# Altium integrated library Samtec 2 mm Pitch Terminal Strips.IntLib: 623 symbols (part 2 of 5) (continued)
## TMM-103-01-T-S-RA
designator P?
Low Profile Through-Hole Header, Right Angle, -55 to 105 degC, 2 mm Pitch, 3-Pin, Male, RoHS; Manufacturer: Samtec; PartNumber: TMM-103-01-T-S-RA; Pitch: 2 mm; DatasheetVersion: F-214; PackageVersion: V, 3/2013; PackageReference: TMM-103-01-X-S-RA; PackageDescription: 2 mm Terminal Strip Assembly (R/A); Supplier 1: Newark; Supplier Part Number 1: 85P2046; Orientation: Right Angle; RoHS: True; Temperature Range: -55 to 105 degC; Mounting Technology: Through-hole; ComponentLink1Description: Manufacturer URL; ComponentLink1URL: http://www.samtec.com; ComponentLink2Description: Datasheet; ComponentLink2URL: http://d2a072wq521u33.cloudfront.net/catalog_english//TMM_TH.PDF; ComponentLink3Description: Package Specification; ComponentLink3URL: http://www.samtec.com/documents/webfiles/cpdf/TMM-1XX-XX-XX-X-RA-XXX-MKT.pdf
footprint SMTC-TMM-103-01-X-S-RA (Terminal Strip Assembly, 1x3 Pins, Right Angle, 2mm Pitch, Male)
pins: 1, 2, 3

## TMM-105-01-F-D-001
designator P?
Low Profile Through-Hole Header, Vertical, -55 to 125 degC, 2 mm Pitch, 10-Pin, Male, RoHS; Manufacturer: Samtec; PartNumber: TMM-105-01-F-D-001; Pitch: 2 mm; DatasheetVersion: F-214; PackageVersion: AW, 11/2011; PackageReference: TMM-105-01-X-D-001; PackageDescription: 2 mm Terminal Strip Assembly; Orientation: Vertical; RoHS: True; Temperature Range: -55 to 125 degC; Mounting Technology: Through-hole; ComponentLink1Description: Manufacturer URL; ComponentLink1URL: http://www.samtec.com; ComponentLink2Description: Datasheet; ComponentLink2URL: http://d2a072wq521u33.cloudfront.net/catalog_english//TMM_TH.PDF; ComponentLink3Description: Package Specification; ComponentLink3URL: http://www.samtec.com/documents/webfiles/cpdf/TMM-1XX-XX-XX-X-XX-XXX-MKT1.pdf
footprint SMTC-TMM-105-01-X-D-001 (Terminal Strip Assembly, 2x5 Pins, Vertical, 2mm Pitch, Male)
pins: 1, 2, 3, 4, 5, 6, 7, 8, 9, 10

## TMM-105-01-F-S-RA
designator P?
Low Profile Through-Hole Header, Right Angle, -55 to 125 degC, 2 mm Pitch, 5-Pin, Male, RoHS; Manufacturer: Samtec; PartNumber: TMM-105-01-F-S-RA; Pitch: 2 mm; DatasheetVersion: F-214; PackageVersion: V, 3/2013; PackageReference: TMM-105-01-X-S-RA; PackageDescription: 2 mm Terminal Strip Assembly (R/A); Orientation: Right Angle; RoHS: True; Temperature Range: -55 to 125 degC; Mounting Technology: Through-hole; ComponentLink1Description: Manufacturer URL; ComponentLink1URL: http://www.samtec.com; ComponentLink2Description: Datasheet; ComponentLink2URL: http://d2a072wq521u33.cloudfront.net/catalog_english//TMM_TH.PDF; ComponentLink3Description: Package Specification; ComponentLink3URL: http://www.samtec.com/documents/webfiles/cpdf/TMM-1XX-XX-XX-X-RA-XXX-MKT.pdf
footprint SMTC-TMM-105-01-X-S-RA (Terminal Strip Assembly, 1x5 Pins, Right Angle, 2mm Pitch, Male)
pins: 1, 2, 3, 4, 5

## TMM-105-01-L-D-001
designator P?
Low Profile Through-Hole Header, Vertical, -55 to 125 degC, 2 mm Pitch, 10-Pin, Male, RoHS; Manufacturer: Samtec; PartNumber: TMM-105-01-L-D-001; Pitch: 2 mm; DatasheetVersion: F-214; PackageVersion: AW, 11/2011; PackageReference: TMM-105-01-X-D-001; PackageDescription: 2 mm Terminal Strip Assembly; Orientation: Vertical; RoHS: True; Temperature Range: -55 to 125 degC; Mounting Technology: Through-hole; ComponentLink1Description: Manufacturer URL; ComponentLink1URL: http://www.samtec.com; ComponentLink2Description: Datasheet; ComponentLink2URL: http://d2a072wq521u33.cloudfront.net/catalog_english//TMM_TH.PDF; ComponentLink3Description: Package Specification; ComponentLink3URL: http://www.samtec.com/documents/webfiles/cpdf/TMM-1XX-XX-XX-X-XX-XXX-MKT1.pdf
footprint SMTC-TMM-105-01-X-D-001 (Terminal Strip Assembly, 2x5 Pins, Vertical, 2mm Pitch, Male)
pins: 1, 2, 3, 4, 5, 6, 7, 8, 9, 10

## TMM-105-01-L-S-RA
designator P?
Low Profile Through-Hole Header, Right Angle, -55 to 125 degC, 2 mm Pitch, 5-Pin, Male, RoHS; Manufacturer: Samtec; PartNumber: TMM-105-01-L-S-RA; Pitch: 2 mm; DatasheetVersion: F-214; PackageVersion: V, 3/2013; PackageReference: TMM-105-01-X-S-RA; PackageDescription: 2 mm Terminal Strip Assembly (R/A); Supplier 1: Newark; Supplier Part Number 1: 85P2829; Orientation: Right Angle; RoHS: True; Temperature Range: -55 to 125 degC; Mounting Technology: Through-hole; ComponentLink1Description: Manufacturer URL; ComponentLink1URL: http://www.samtec.com; ComponentLink2Description: Datasheet; ComponentLink2URL: http://d2a072wq521u33.cloudfront.net/catalog_english//TMM_TH.PDF; ComponentLink3Description: Package Specification; ComponentLink3URL: http://www.samtec.com/documents/webfiles/cpdf/TMM-1XX-XX-XX-X-RA-XXX-MKT.pdf
footprint SMTC-TMM-105-01-X-S-RA (Terminal Strip Assembly, 1x5 Pins, Right Angle, 2mm Pitch, Male)
pins: 1, 2, 3, 4, 5

## TMM-105-01-S-D-001
designator P?
Low Profile Through-Hole Header, Vertical, -55 to 125 degC, 2 mm Pitch, 10-Pin, Male, RoHS; Manufacturer: Samtec; PartNumber: TMM-105-01-S-D-001; Pitch: 2 mm; DatasheetVersion: F-214; PackageVersion: AW, 11/2011; PackageReference: TMM-105-01-X-D-001; PackageDescription: 2 mm Terminal Strip Assembly; Orientation: Vertical; RoHS: True; Temperature Range: -55 to 125 degC; Mounting Technology: Through-hole; ComponentLink1Description: Manufacturer URL; ComponentLink1URL: http://www.samtec.com; ComponentLink2Description: Datasheet; ComponentLink2URL: http://d2a072wq521u33.cloudfront.net/catalog_english//TMM_TH.PDF; ComponentLink3Description: Package Specification; ComponentLink3URL: http://www.samtec.com/documents/webfiles/cpdf/TMM-1XX-XX-XX-X-XX-XXX-MKT1.pdf
footprint SMTC-TMM-105-01-X-D-001 (Terminal Strip Assembly, 2x5 Pins, Vertical, 2mm Pitch, Male)
pins: 1, 2, 3, 4, 5, 6, 7, 8, 9, 10

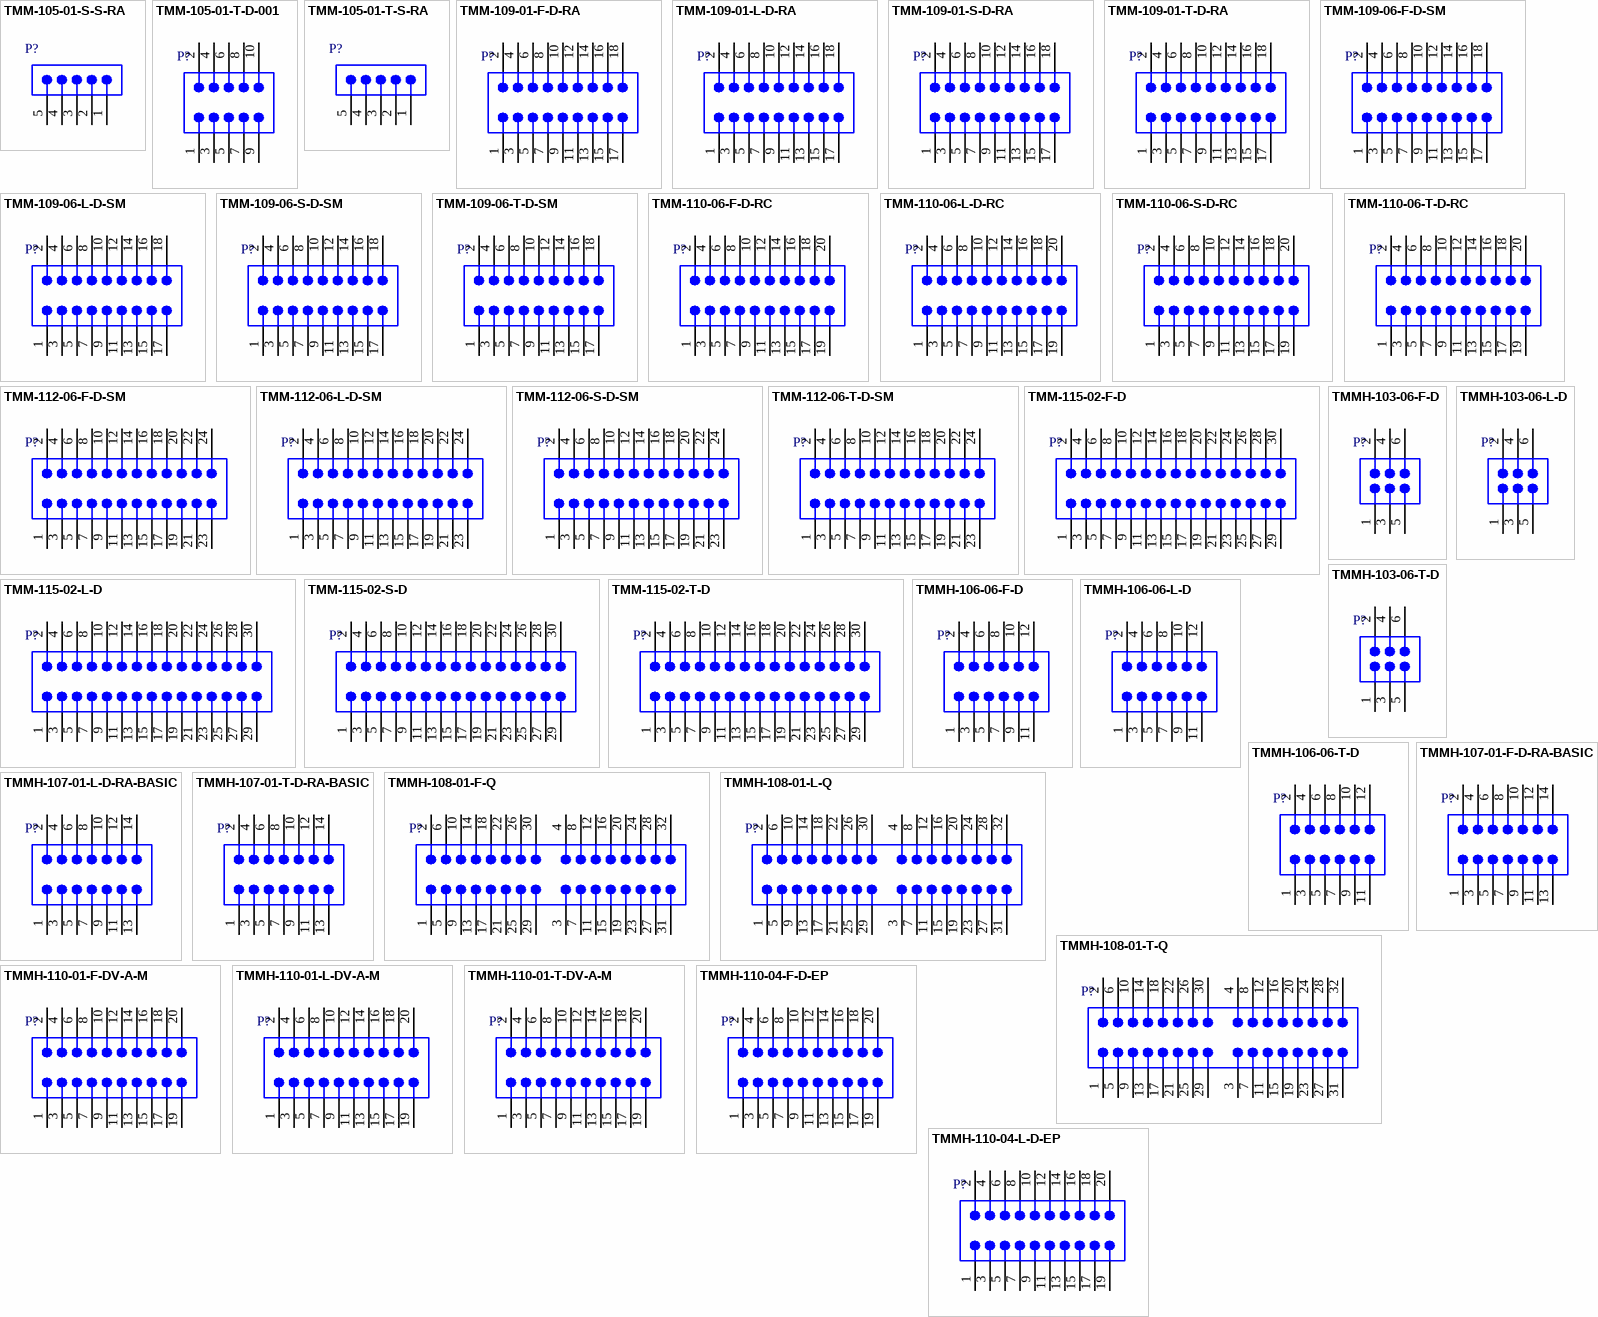
[diagram p6: symbols TMM-105-01-S-S-RA to TMMH-110-04-L-D-EP]

## TMM-105-01-S-S-RA
designator P?
Low Profile Through-Hole Header, Right Angle, -55 to 125 degC, 2 mm Pitch, 5-Pin, Male, RoHS; Manufacturer: Samtec; PartNumber: TMM-105-01-S-S-RA; Pitch: 2 mm; DatasheetVersion: F-214; PackageVersion: V, 3/2013; PackageReference: TMM-105-01-X-S-RA; PackageDescription: 2 mm Terminal Strip Assembly (R/A); Orientation: Right Angle; RoHS: True; Temperature Range: -55 to 125 degC; Mounting Technology: Through-hole; ComponentLink1Description: Manufacturer URL; ComponentLink1URL: http://www.samtec.com; ComponentLink2Description: Datasheet; ComponentLink2URL: http://d2a072wq521u33.cloudfront.net/catalog_english//TMM_TH.PDF; ComponentLink3Description: Package Specification; ComponentLink3URL: http://www.samtec.com/documents/webfiles/cpdf/TMM-1XX-XX-XX-X-RA-XXX-MKT.pdf
footprint SMTC-TMM-105-01-X-S-RA (Terminal Strip Assembly, 1x5 Pins, Right Angle, 2mm Pitch, Male)
pins: 1, 2, 3, 4, 5

## TMM-105-01-T-D-001
designator P?
Low Profile Through-Hole Header, Vertical, -55 to 105 degC, 2 mm Pitch, 10-Pin, Male, RoHS; Manufacturer: Samtec; PartNumber: TMM-105-01-T-D-001; Pitch: 2 mm; DatasheetVersion: F-214; PackageVersion: AW, 11/2011; PackageReference: TMM-105-01-X-D-001; PackageDescription: 2 mm Terminal Strip Assembly; Orientation: Vertical; RoHS: True; Temperature Range: -55 to 105 degC; Mounting Technology: Through-hole; ComponentLink1Description: Manufacturer URL; ComponentLink1URL: http://www.samtec.com; ComponentLink2Description: Datasheet; ComponentLink2URL: http://d2a072wq521u33.cloudfront.net/catalog_english//TMM_TH.PDF; ComponentLink3Description: Package Specification; ComponentLink3URL: http://www.samtec.com/documents/webfiles/cpdf/TMM-1XX-XX-XX-X-XX-XXX-MKT1.pdf
footprint SMTC-TMM-105-01-X-D-001 (Terminal Strip Assembly, 2x5 Pins, Vertical, 2mm Pitch, Male)
pins: 1, 2, 3, 4, 5, 6, 7, 8, 9, 10

## TMM-105-01-T-S-RA
designator P?
Low Profile Through-Hole Header, Right Angle, -55 to 105 degC, 2 mm Pitch, 5-Pin, Male, RoHS; Manufacturer: Samtec; PartNumber: TMM-105-01-T-S-RA; Pitch: 2 mm; DatasheetVersion: F-214; PackageVersion: V, 3/2013; PackageReference: TMM-105-01-X-S-RA; PackageDescription: 2 mm Terminal Strip Assembly (R/A); Supplier 1: Newark; Supplier Part Number 1: 85P3000; Orientation: Right Angle; RoHS: True; Temperature Range: -55 to 105 degC; Mounting Technology: Through-hole; ComponentLink1Description: Manufacturer URL; ComponentLink1URL: http://www.samtec.com; ComponentLink2Description: Datasheet; ComponentLink2URL: http://d2a072wq521u33.cloudfront.net/catalog_english//TMM_TH.PDF; ComponentLink3Description: Package Specification; ComponentLink3URL: http://www.samtec.com/documents/webfiles/cpdf/TMM-1XX-XX-XX-X-RA-XXX-MKT.pdf
footprint SMTC-TMM-105-01-X-S-RA (Terminal Strip Assembly, 1x5 Pins, Right Angle, 2mm Pitch, Male)
pins: 1, 2, 3, 4, 5

## TMM-109-01-F-D-RA
designator P?
Low Profile Through-Hole Header, Right Angle, -55 to 125 degC, 2 mm Pitch, 18-Pin, Male, RoHS; Manufacturer: Samtec; PartNumber: TMM-109-01-F-D-RA; Pitch: 2 mm; DatasheetVersion: F-214; PackageVersion: V, 3/2013; PackageReference: TMM-109-01-X-D-RA; PackageDescription: 2 mm Terminal Strip Assembly (R/A); Orientation: Right Angle; RoHS: True; Temperature Range: -55 to 125 degC; Mounting Technology: Through-hole; ComponentLink1Description: Manufacturer URL; ComponentLink1URL: http://www.samtec.com; ComponentLink2Description: Datasheet; ComponentLink2URL: http://d2a072wq521u33.cloudfront.net/catalog_english//TMM_TH.PDF; ComponentLink3Description: Package Specification; ComponentLink3URL: http://www.samtec.com/documents/webfiles/cpdf/TMM-1XX-XX-XX-X-RA-XXX-MKT.pdf
footprint SMTC-TMM-109-01-X-D-RA (Terminal Strip Assembly, 2x9 Pins, Right Angle, 2mm Pitch, Male)
pins: 1, 2, 3, 4, 5, 6, 7, 8, 9, 10, 11, 12, 13, 14, 15, 16, 17, 18

## TMM-109-01-L-D-RA
designator P?
Low Profile Through-Hole Header, Right Angle, -55 to 125 degC, 2 mm Pitch, 18-Pin, Male, RoHS; Manufacturer: Samtec; PartNumber: TMM-109-01-L-D-RA; Pitch: 2 mm; DatasheetVersion: F-214; PackageVersion: V, 3/2013; PackageReference: TMM-109-01-X-D-RA; PackageDescription: 2 mm Terminal Strip Assembly (R/A); Supplier 1: Newark; Supplier Part Number 1: 85P4848; Orientation: Right Angle; RoHS: True; Temperature Range: -55 to 125 degC; Mounting Technology: Through-hole; ComponentLink1Description: Manufacturer URL; ComponentLink1URL: http://www.samtec.com; ComponentLink2Description: Datasheet; ComponentLink2URL: http://d2a072wq521u33.cloudfront.net/catalog_english//TMM_TH.PDF; ComponentLink3Description: Package Specification; ComponentLink3URL: http://www.samtec.com/documents/webfiles/cpdf/TMM-1XX-XX-XX-X-RA-XXX-MKT.pdf
footprint SMTC-TMM-109-01-X-D-RA (Terminal Strip Assembly, 2x9 Pins, Right Angle, 2mm Pitch, Male)
pins: 1, 2, 3, 4, 5, 6, 7, 8, 9, 10, 11, 12, 13, 14, 15, 16, 17, 18

## TMM-109-01-S-D-RA
designator P?
Low Profile Through-Hole Header, Right Angle, -55 to 125 degC, 2 mm Pitch, 18-Pin, Male, RoHS; Manufacturer: Samtec; PartNumber: TMM-109-01-S-D-RA; Pitch: 2 mm; DatasheetVersion: F-214; PackageVersion: V, 3/2013; PackageReference: TMM-109-01-X-D-RA; PackageDescription: 2 mm Terminal Strip Assembly (R/A); Orientation: Right Angle; RoHS: True; Temperature Range: -55 to 125 degC; Mounting Technology: Through-hole; ComponentLink1Description: Manufacturer URL; ComponentLink1URL: http://www.samtec.com; ComponentLink2Description: Datasheet; ComponentLink2URL: http://d2a072wq521u33.cloudfront.net/catalog_english//TMM_TH.PDF; ComponentLink3Description: Package Specification; ComponentLink3URL: http://www.samtec.com/documents/webfiles/cpdf/TMM-1XX-XX-XX-X-RA-XXX-MKT.pdf
footprint SMTC-TMM-109-01-X-D-RA (Terminal Strip Assembly, 2x9 Pins, Right Angle, 2mm Pitch, Male)
pins: 1, 2, 3, 4, 5, 6, 7, 8, 9, 10, 11, 12, 13, 14, 15, 16, 17, 18

## TMM-109-01-T-D-RA
designator P?
Low Profile Through-Hole Header, Right Angle, -55 to 105 degC, 2 mm Pitch, 18-Pin, Male, RoHS; Manufacturer: Samtec; PartNumber: TMM-109-01-T-D-RA; Pitch: 2 mm; DatasheetVersion: F-214; PackageVersion: V, 3/2013; PackageReference: TMM-109-01-X-D-RA; PackageDescription: 2 mm Terminal Strip Assembly (R/A); Supplier 1: Newark; Supplier Part Number 1: 85P4970; Orientation: Right Angle; RoHS: True; Temperature Range: -55 to 105 degC; Mounting Technology: Through-hole; ComponentLink1Description: Manufacturer URL; ComponentLink1URL: http://www.samtec.com; ComponentLink2Description: Datasheet; ComponentLink2URL: http://d2a072wq521u33.cloudfront.net/catalog_english//TMM_TH.PDF; ComponentLink3Description: Package Specification; ComponentLink3URL: http://www.samtec.com/documents/webfiles/cpdf/TMM-1XX-XX-XX-X-RA-XXX-MKT.pdf
footprint SMTC-TMM-109-01-X-D-RA (Terminal Strip Assembly, 2x9 Pins, Right Angle, 2mm Pitch, Male)
pins: 1, 2, 3, 4, 5, 6, 7, 8, 9, 10, 11, 12, 13, 14, 15, 16, 17, 18

## TMM-109-06-F-D-SM
designator P?
Low Profile SMT Header, Vertical, -55 to 125 degC, 2 mm Pitch, 18-Pin, Male, RoHS; Manufacturer: Samtec; PartNumber: TMM-109-06-F-D-SM; Pitch: 2 mm; DatasheetVersion: F-214; PackageVersion: BY, 10/2013; PackageReference: TMM-109-06-X-D-SM; PackageDescription: 2 mm Terminal Strip Assembly; Orientation: Vertical; RoHS: True; Temperature Range: -55 to 125 degC; Mounting Technology: Surface Mount; ComponentLink1Description: Manufacturer URL; ComponentLink1URL: http://www.samtec.com; ComponentLink2Description: Datasheet; ComponentLink2URL: http://d2a072wq521u33.cloudfront.net/catalog_english//TMM_SM.PDF; ComponentLink3Description: Package Specification; ComponentLink3URL: http://www.samtec.com/documents/webfiles/cpdf/TMM-1XX-XX-XX-X-SM-XX-X-MKT.pdf
footprint SMTC-TMM-109-06-X-D-SM (Terminal Strip Assembly, 2x9 Pins, Vertical, 2mm Pitch, Male)
pins: 1, 2, 3, 4, 5, 6, 7, 8, 9, 10, 11, 12, 13, 14, 15, 16, 17, 18

## TMM-109-06-L-D-SM
designator P?
Low Profile SMT Header, Vertical, -55 to 125 degC, 2 mm Pitch, 18-Pin, Male, RoHS; Manufacturer: Samtec; PartNumber: TMM-109-06-L-D-SM; Pitch: 2 mm; DatasheetVersion: F-214; PackageVersion: BY, 10/2013; PackageReference: TMM-109-06-X-D-SM; PackageDescription: 2 mm Terminal Strip Assembly; Orientation: Vertical; RoHS: True; Temperature Range: -55 to 125 degC; Mounting Technology: Surface Mount; ComponentLink1Description: Manufacturer URL; ComponentLink1URL: http://www.samtec.com; ComponentLink2Description: Datasheet; ComponentLink2URL: http://d2a072wq521u33.cloudfront.net/catalog_english//TMM_SM.PDF; ComponentLink3Description: Package Specification; ComponentLink3URL: http://www.samtec.com/documents/webfiles/cpdf/TMM-1XX-XX-XX-X-SM-XX-X-MKT.pdf
footprint SMTC-TMM-109-06-X-D-SM (Terminal Strip Assembly, 2x9 Pins, Vertical, 2mm Pitch, Male)
pins: 1, 2, 3, 4, 5, 6, 7, 8, 9, 10, 11, 12, 13, 14, 15, 16, 17, 18

## TMM-109-06-S-D-SM
designator P?
Low Profile SMT Header, Vertical, -55 to 125 degC, 2 mm Pitch, 18-Pin, Male, RoHS; Manufacturer: Samtec; PartNumber: TMM-109-06-S-D-SM; Pitch: 2 mm; DatasheetVersion: F-214; PackageVersion: BY, 10/2013; PackageReference: TMM-109-06-X-D-SM; PackageDescription: 2 mm Terminal Strip Assembly; Orientation: Vertical; RoHS: True; Temperature Range: -55 to 125 degC; Mounting Technology: Surface Mount; ComponentLink1Description: Manufacturer URL; ComponentLink1URL: http://www.samtec.com; ComponentLink2Description: Datasheet; ComponentLink2URL: http://d2a072wq521u33.cloudfront.net/catalog_english//TMM_SM.PDF; ComponentLink3Description: Package Specification; ComponentLink3URL: http://www.samtec.com/documents/webfiles/cpdf/TMM-1XX-XX-XX-X-SM-XX-X-MKT.pdf
footprint SMTC-TMM-109-06-X-D-SM (Terminal Strip Assembly, 2x9 Pins, Vertical, 2mm Pitch, Male)
pins: 1, 2, 3, 4, 5, 6, 7, 8, 9, 10, 11, 12, 13, 14, 15, 16, 17, 18

## TMM-109-06-T-D-SM
designator P?
Low Profile SMT Header, Vertical, -55 to 105 degC, 2 mm Pitch, 18-Pin, Male, RoHS; Manufacturer: Samtec; PartNumber: TMM-109-06-T-D-SM; Pitch: 2 mm; DatasheetVersion: F-214; PackageVersion: BY, 10/2013; PackageReference: TMM-109-06-X-D-SM; PackageDescription: 2 mm Terminal Strip Assembly; Orientation: Vertical; RoHS: True; Temperature Range: -55 to 105 degC; Mounting Technology: Surface Mount; ComponentLink1Description: Manufacturer URL; ComponentLink1URL: http://www.samtec.com; ComponentLink2Description: Datasheet; ComponentLink2URL: http://d2a072wq521u33.cloudfront.net/catalog_english//TMM_SM.PDF; ComponentLink3Description: Package Specification; ComponentLink3URL: http://www.samtec.com/documents/webfiles/cpdf/TMM-1XX-XX-XX-X-SM-XX-X-MKT.pdf
footprint SMTC-TMM-109-06-X-D-SM (Terminal Strip Assembly, 2x9 Pins, Vertical, 2mm Pitch, Male)
pins: 1, 2, 3, 4, 5, 6, 7, 8, 9, 10, 11, 12, 13, 14, 15, 16, 17, 18

## TMM-110-06-F-D-RC
designator P?
Low Profile Through-Hole Header, Vertical, -55 to 125 degC, 2 mm Pitch, 20-Pin, Male, RoHS; Manufacturer: Samtec; PartNumber: TMM-110-06-F-D-RC; Pitch: 2 mm; DatasheetVersion: F-214; PackageVersion: AW, 11/2011; PackageReference: TMM-110-06-X-D-RC; PackageDescription: 2 mm Terminal Strip Assembly; Orientation: Vertical; RoHS: True; Temperature Range: -55 to 125 degC; Mounting Technology: Through-hole; ComponentLink1Description: Manufacturer URL; ComponentLink1URL: http://www.samtec.com; ComponentLink2Description: Datasheet; ComponentLink2URL: http://d2a072wq521u33.cloudfront.net/catalog_english//TMM_TH.PDF; ComponentLink3Description: Package Specification; ComponentLink3URL: http://www.samtec.com/documents/webfiles/cpdf/TMM-1XX-XX-XX-X-XX-XXX-MKT1.pdf
footprint SMTC-TMM-110-06-X-D-RC (Terminal Strip Assembly, 2x10 Pins, Vertical, 2mm Pitch, Male)
pins: 1, 2, 3, 4, 5, 6, 7, 8, 9, 10, 11, 12, 13, 14, 15, 16, 17, 18, 19, 20

## TMM-110-06-L-D-RC
designator P?
Low Profile Through-Hole Header, Vertical, -55 to 125 degC, 2 mm Pitch, 20-Pin, Male, RoHS; Manufacturer: Samtec; PartNumber: TMM-110-06-L-D-RC; Pitch: 2 mm; DatasheetVersion: F-214; PackageVersion: AW, 11/2011; PackageReference: TMM-110-06-X-D-RC; PackageDescription: 2 mm Terminal Strip Assembly; Orientation: Vertical; RoHS: True; Temperature Range: -55 to 125 degC; Mounting Technology: Through-hole; ComponentLink1Description: Manufacturer URL; ComponentLink1URL: http://www.samtec.com; ComponentLink2Description: Datasheet; ComponentLink2URL: http://d2a072wq521u33.cloudfront.net/catalog_english//TMM_TH.PDF; ComponentLink3Description: Package Specification; ComponentLink3URL: http://www.samtec.com/documents/webfiles/cpdf/TMM-1XX-XX-XX-X-XX-XXX-MKT1.pdf
footprint SMTC-TMM-110-06-X-D-RC (Terminal Strip Assembly, 2x10 Pins, Vertical, 2mm Pitch, Male)
pins: 1, 2, 3, 4, 5, 6, 7, 8, 9, 10, 11, 12, 13, 14, 15, 16, 17, 18, 19, 20

## TMM-110-06-S-D-RC
designator P?
Low Profile Through-Hole Header, Vertical, -55 to 125 degC, 2 mm Pitch, 20-Pin, Male, RoHS; Manufacturer: Samtec; PartNumber: TMM-110-06-S-D-RC; Pitch: 2 mm; DatasheetVersion: F-214; PackageVersion: AW, 11/2011; PackageReference: TMM-110-06-X-D-RC; PackageDescription: 2 mm Terminal Strip Assembly; Orientation: Vertical; RoHS: True; Temperature Range: -55 to 125 degC; Mounting Technology: Through-hole; ComponentLink1Description: Manufacturer URL; ComponentLink1URL: http://www.samtec.com; ComponentLink2Description: Datasheet; ComponentLink2URL: http://d2a072wq521u33.cloudfront.net/catalog_english//TMM_TH.PDF; ComponentLink3Description: Package Specification; ComponentLink3URL: http://www.samtec.com/documents/webfiles/cpdf/TMM-1XX-XX-XX-X-XX-XXX-MKT1.pdf
footprint SMTC-TMM-110-06-X-D-RC (Terminal Strip Assembly, 2x10 Pins, Vertical, 2mm Pitch, Male)
pins: 1, 2, 3, 4, 5, 6, 7, 8, 9, 10, 11, 12, 13, 14, 15, 16, 17, 18, 19, 20

## TMM-110-06-T-D-RC
designator P?
Low Profile Through-Hole Header, Vertical, -55 to 105 degC, 2 mm Pitch, 20-Pin, Male, RoHS; Manufacturer: Samtec; PartNumber: TMM-110-06-T-D-RC; Pitch: 2 mm; DatasheetVersion: F-214; PackageVersion: AW, 11/2011; PackageReference: TMM-110-06-X-D-RC; PackageDescription: 2 mm Terminal Strip Assembly; Orientation: Vertical; RoHS: True; Temperature Range: -55 to 105 degC; Mounting Technology: Through-hole; ComponentLink1Description: Manufacturer URL; ComponentLink1URL: http://www.samtec.com; ComponentLink2Description: Datasheet; ComponentLink2URL: http://d2a072wq521u33.cloudfront.net/catalog_english//TMM_TH.PDF; ComponentLink3Description: Package Specification; ComponentLink3URL: http://www.samtec.com/documents/webfiles/cpdf/TMM-1XX-XX-XX-X-XX-XXX-MKT1.pdf
footprint SMTC-TMM-110-06-X-D-RC (Terminal Strip Assembly, 2x10 Pins, Vertical, 2mm Pitch, Male)
pins: 1, 2, 3, 4, 5, 6, 7, 8, 9, 10, 11, 12, 13, 14, 15, 16, 17, 18, 19, 20

## TMM-112-06-F-D-SM
designator P?
Low Profile SMT Header, Vertical, -55 to 125 degC, 2 mm Pitch, 24-Pin, Male, RoHS; Manufacturer: Samtec; PartNumber: TMM-112-06-F-D-SM; Pitch: 2 mm; DatasheetVersion: F-214; PackageVersion: BY, 10/2013; PackageReference: TMM-112-06-X-D-SM; PackageDescription: 2 mm Terminal Strip Assembly; Orientation: Vertical; RoHS: True; Temperature Range: -55 to 125 degC; Mounting Technology: Surface Mount; ComponentLink1Description: Manufacturer URL; ComponentLink1URL: http://www.samtec.com; ComponentLink2Description: Datasheet; ComponentLink2URL: http://d2a072wq521u33.cloudfront.net/catalog_english//TMM_SM.PDF; ComponentLink3Description: Package Specification; ComponentLink3URL: http://www.samtec.com/documents/webfiles/cpdf/TMM-1XX-XX-XX-X-SM-XX-X-MKT.pdf
footprint SMTC-TMM-112-06-X-D-SM (Terminal Strip Assembly, 2x12 Pins, Vertical, 2mm Pitch, Male)
pins: 1, 2, 3, 4, 5, 6, 7, 8, 9, 10, 11, 12, 13, 14, 15, 16, 17, 18, 19, 20, 21, 22, 23, 24

## TMM-112-06-L-D-SM
designator P?
Low Profile SMT Header, Vertical, -55 to 125 degC, 2 mm Pitch, 24-Pin, Male, RoHS; Manufacturer: Samtec; PartNumber: TMM-112-06-L-D-SM; Pitch: 2 mm; DatasheetVersion: F-214; PackageVersion: BY, 10/2013; PackageReference: TMM-112-06-X-D-SM; PackageDescription: 2 mm Terminal Strip Assembly; Orientation: Vertical; RoHS: True; Temperature Range: -55 to 125 degC; Mounting Technology: Surface Mount; ComponentLink1Description: Manufacturer URL; ComponentLink1URL: http://www.samtec.com; ComponentLink2Description: Datasheet; ComponentLink2URL: http://d2a072wq521u33.cloudfront.net/catalog_english//TMM_SM.PDF; ComponentLink3Description: Package Specification; ComponentLink3URL: http://www.samtec.com/documents/webfiles/cpdf/TMM-1XX-XX-XX-X-SM-XX-X-MKT.pdf
footprint SMTC-TMM-112-06-X-D-SM (Terminal Strip Assembly, 2x12 Pins, Vertical, 2mm Pitch, Male)
pins: 1, 2, 3, 4, 5, 6, 7, 8, 9, 10, 11, 12, 13, 14, 15, 16, 17, 18, 19, 20, 21, 22, 23, 24

## TMM-112-06-S-D-SM
designator P?
Low Profile SMT Header, Vertical, -55 to 125 degC, 2 mm Pitch, 24-Pin, Male, RoHS; Manufacturer: Samtec; PartNumber: TMM-112-06-S-D-SM; Pitch: 2 mm; DatasheetVersion: F-214; PackageVersion: BY, 10/2013; PackageReference: TMM-112-06-X-D-SM; PackageDescription: 2 mm Terminal Strip Assembly; Orientation: Vertical; RoHS: True; Temperature Range: -55 to 125 degC; Mounting Technology: Surface Mount; ComponentLink1Description: Manufacturer URL; ComponentLink1URL: http://www.samtec.com; ComponentLink2Description: Datasheet; ComponentLink2URL: http://d2a072wq521u33.cloudfront.net/catalog_english//TMM_SM.PDF; ComponentLink3Description: Package Specification; ComponentLink3URL: http://www.samtec.com/documents/webfiles/cpdf/TMM-1XX-XX-XX-X-SM-XX-X-MKT.pdf
footprint SMTC-TMM-112-06-X-D-SM (Terminal Strip Assembly, 2x12 Pins, Vertical, 2mm Pitch, Male)
pins: 1, 2, 3, 4, 5, 6, 7, 8, 9, 10, 11, 12, 13, 14, 15, 16, 17, 18, 19, 20, 21, 22, 23, 24

## TMM-112-06-T-D-SM
designator P?
Low Profile SMT Header, Vertical, -55 to 105 degC, 2 mm Pitch, 24-Pin, Male, RoHS; Manufacturer: Samtec; PartNumber: TMM-112-06-T-D-SM; Pitch: 2 mm; DatasheetVersion: F-214; PackageVersion: BY, 10/2013; PackageReference: TMM-112-06-X-D-SM; PackageDescription: 2 mm Terminal Strip Assembly; Orientation: Vertical; RoHS: True; Temperature Range: -55 to 105 degC; Mounting Technology: Surface Mount; ComponentLink1Description: Manufacturer URL; ComponentLink1URL: http://www.samtec.com; ComponentLink2Description: Datasheet; ComponentLink2URL: http://d2a072wq521u33.cloudfront.net/catalog_english//TMM_SM.PDF; ComponentLink3Description: Package Specification; ComponentLink3URL: http://www.samtec.com/documents/webfiles/cpdf/TMM-1XX-XX-XX-X-SM-XX-X-MKT.pdf
footprint SMTC-TMM-112-06-X-D-SM (Terminal Strip Assembly, 2x12 Pins, Vertical, 2mm Pitch, Male)
pins: 1, 2, 3, 4, 5, 6, 7, 8, 9, 10, 11, 12, 13, 14, 15, 16, 17, 18, 19, 20, 21, 22, 23, 24

## TMM-115-02-F-D
designator P?
Low Profile Through-Hole Header, Vertical, -55 to 125 degC, 2 mm Pitch, 30-Pin, Male, RoHS; Manufacturer: Samtec; PartNumber: TMM-115-02-F-D; Pitch: 2 mm; DatasheetVersion: F-214; PackageVersion: AW, 11/2011; PackageReference: TMM-115-02-X-D; PackageDescription: 2 mm Terminal Strip Assembly; Orientation: Vertical; RoHS: True; Temperature Range: -55 to 125 degC; Mounting Technology: Through-hole; ComponentLink1Description: Manufacturer URL; ComponentLink1URL: http://www.samtec.com; ComponentLink2Description: Datasheet; ComponentLink2URL: http://d2a072wq521u33.cloudfront.net/catalog_english//TMM_TH.PDF; ComponentLink3Description: Package Specification; ComponentLink3URL: http://www.samtec.com/documents/webfiles/cpdf/TMM-1XX-XX-XX-X-XX-XXX-MKT1.pdf
footprint SMTC-TMM-115-02-X-D (Terminal Strip Assembly, 2x15 Pins, Vertical, 2mm Pitch, Male)
pins: 1, 2, 3, 4, 5, 6, 7, 8, 9, 10, 11, 12, 13, 14, 15, 16, 17, 18, 19, 20, 21, 22, 23, 24, 25, 26, 27, 28, 29, 30

## TMM-115-02-L-D
designator P?
Low Profile Through-Hole Header, Vertical, -55 to 125 degC, 2 mm Pitch, 30-Pin, Male, RoHS; Manufacturer: Samtec; PartNumber: TMM-115-02-L-D; Pitch: 2 mm; DatasheetVersion: F-214; PackageVersion: AW, 11/2011; PackageReference: TMM-115-02-X-D; PackageDescription: 2 mm Terminal Strip Assembly; Supplier 1: Newark; Supplier Part Number 1: 96H7246; Orientation: Vertical; RoHS: True; Temperature Range: -55 to 125 degC; Mounting Technology: Through-hole; ComponentLink1Description: Manufacturer URL; ComponentLink1URL: http://www.samtec.com; ComponentLink2Description: Datasheet; ComponentLink2URL: http://d2a072wq521u33.cloudfront.net/catalog_english//TMM_TH.PDF; ComponentLink3Description: Package Specification; ComponentLink3URL: http://www.samtec.com/documents/webfiles/cpdf/TMM-1XX-XX-XX-X-XX-XXX-MKT1.pdf
footprint SMTC-TMM-115-02-X-D (Terminal Strip Assembly, 2x15 Pins, Vertical, 2mm Pitch, Male)
pins: 1, 2, 3, 4, 5, 6, 7, 8, 9, 10, 11, 12, 13, 14, 15, 16, 17, 18, 19, 20, 21, 22, 23, 24, 25, 26, 27, 28, 29, 30

## TMM-115-02-S-D
designator P?
Low Profile Through-Hole Header, Vertical, -55 to 125 degC, 2 mm Pitch, 30-Pin, Male, RoHS; Manufacturer: Samtec; PartNumber: TMM-115-02-S-D; Pitch: 2 mm; DatasheetVersion: F-214; PackageVersion: AW, 11/2011; PackageReference: TMM-115-02-X-D; PackageDescription: 2 mm Terminal Strip Assembly; Orientation: Vertical; RoHS: True; Temperature Range: -55 to 125 degC; Mounting Technology: Through-hole; ComponentLink1Description: Manufacturer URL; ComponentLink1URL: http://www.samtec.com; ComponentLink2Description: Datasheet; ComponentLink2URL: http://d2a072wq521u33.cloudfront.net/catalog_english//TMM_TH.PDF; ComponentLink3Description: Package Specification; ComponentLink3URL: http://www.samtec.com/documents/webfiles/cpdf/TMM-1XX-XX-XX-X-XX-XXX-MKT1.pdf
footprint SMTC-TMM-115-02-X-D (Terminal Strip Assembly, 2x15 Pins, Vertical, 2mm Pitch, Male)
pins: 1, 2, 3, 4, 5, 6, 7, 8, 9, 10, 11, 12, 13, 14, 15, 16, 17, 18, 19, 20, 21, 22, 23, 24, 25, 26, 27, 28, 29, 30

## TMM-115-02-T-D
designator P?
Low Profile Through-Hole Header, Vertical, -55 to 105 degC, 2 mm Pitch, 30-Pin, Male, RoHS; Manufacturer: Samtec; PartNumber: TMM-115-02-T-D; Pitch: 2 mm; DatasheetVersion: F-214; PackageVersion: AW, 11/2011; PackageReference: TMM-115-02-X-D; PackageDescription: 2 mm Terminal Strip Assembly; Supplier 1: Newark; Supplier Part Number 1: 85P8003; Orientation: Vertical; RoHS: True; Temperature Range: -55 to 105 degC; Mounting Technology: Through-hole; ComponentLink1Description: Manufacturer URL; ComponentLink1URL: http://www.samtec.com; ComponentLink2Description: Datasheet; ComponentLink2URL: http://d2a072wq521u33.cloudfront.net/catalog_english//TMM_TH.PDF; ComponentLink3Description: Package Specification; ComponentLink3URL: http://www.samtec.com/documents/webfiles/cpdf/TMM-1XX-XX-XX-X-XX-XXX-MKT1.pdf
footprint SMTC-TMM-115-02-X-D (Terminal Strip Assembly, 2x15 Pins, Vertical, 2mm Pitch, Male)
pins: 1, 2, 3, 4, 5, 6, 7, 8, 9, 10, 11, 12, 13, 14, 15, 16, 17, 18, 19, 20, 21, 22, 23, 24, 25, 26, 27, 28, 29, 30

## TMMH-103-06-F-D
designator P?
Flexible Through-Hole Header, Vertical, -55 to 125 degC, 2 mm Pitch, 6-Pin, Male, RoHS; Manufacturer: Samtec; PartNumber: TMMH-103-06-F-D; Pitch: 2 mm; DatasheetVersion: F-214; PackageVersion: AR, 12/1996; PackageReference: TMMH-103-06-X-D; PackageDescription: 2mm x 2mm Terminal Strip Assembly; Supplier 1: Newark; Supplier Part Number 1: 85T6584; Orientation: Vertical; RoHS: True; Temperature Range: -55 to 125 degC; Mounting Technology: Through-hole; ComponentLink1Description: Manufacturer URL; ComponentLink1URL: http://www.samtec.com; ComponentLink2Description: Datasheet; ComponentLink2URL: http://d2a072wq521u33.cloudfront.net/catalog_english//TMMH_TH.PDF; ComponentLink3Description: Package Specification; ComponentLink3URL: http://www.samtec.com/documents/webfiles/cpdf/TMMH-1XX-XX-XX-D-XXX-XXX-MKT1.pdf
footprint SMTC-TMMH-103-06-X-D (Terminal Strip Assembly, 2x3 Pins, Vertical, 2mm Pitch, Male)
pins: 1, 2, 3, 4, 5, 6

## TMMH-103-06-L-D
designator P?
Flexible Through-Hole Header, Vertical, -55 to 125 degC, 2 mm Pitch, 6-Pin, Male, RoHS; Manufacturer: Samtec; PartNumber: TMMH-103-06-L-D; Pitch: 2 mm; DatasheetVersion: F-214; PackageVersion: AR, 12/1996; PackageReference: TMMH-103-06-X-D; PackageDescription: 2mm x 2mm Terminal Strip Assembly; Supplier 1: Newark; Supplier Part Number 1: 85T6587; Orientation: Vertical; RoHS: True; Temperature Range: -55 to 125 degC; Mounting Technology: Through-hole; ComponentLink1Description: Manufacturer URL; ComponentLink1URL: http://www.samtec.com; ComponentLink2Description: Datasheet; ComponentLink2URL: http://d2a072wq521u33.cloudfront.net/catalog_english//TMMH_TH.PDF; ComponentLink3Description: Package Specification; ComponentLink3URL: http://www.samtec.com/documents/webfiles/cpdf/TMMH-1XX-XX-XX-D-XXX-XXX-MKT1.pdf
footprint SMTC-TMMH-103-06-X-D (Terminal Strip Assembly, 2x3 Pins, Vertical, 2mm Pitch, Male)
pins: 1, 2, 3, 4, 5, 6

## TMMH-103-06-T-D
designator P?
Flexible Through-Hole Header, Vertical, -55 to 105 degC, 2 mm Pitch, 6-Pin, Male, RoHS; Manufacturer: Samtec; PartNumber: TMMH-103-06-T-D; Pitch: 2 mm; DatasheetVersion: F-214; PackageVersion: AR, 12/1996; PackageReference: TMMH-103-06-X-D; PackageDescription: 2mm x 2mm Terminal Strip Assembly; Supplier 1: Newark; Supplier Part Number 1: 85T6588; Orientation: Vertical; RoHS: True; Temperature Range: -55 to 105 degC; Mounting Technology: Through-hole; ComponentLink1Description: Manufacturer URL; ComponentLink1URL: http://www.samtec.com; ComponentLink2Description: Datasheet; ComponentLink2URL: http://d2a072wq521u33.cloudfront.net/catalog_english//TMMH_TH.PDF; ComponentLink3Description: Package Specification; ComponentLink3URL: http://www.samtec.com/documents/webfiles/cpdf/TMMH-1XX-XX-XX-D-XXX-XXX-MKT1.pdf
footprint SMTC-TMMH-103-06-X-D (Terminal Strip Assembly, 2x3 Pins, Vertical, 2mm Pitch, Male)
pins: 1, 2, 3, 4, 5, 6

## TMMH-106-06-F-D
designator P?
Flexible Through-Hole Header, Vertical, -55 to 125 degC, 2 mm Pitch, 12-Pin, Male, RoHS; Manufacturer: Samtec; PartNumber: TMMH-106-06-F-D; Pitch: 2 mm; DatasheetVersion: F-214; PackageVersion: AR, 12/1996; PackageReference: TMMH-106-06-X-D; PackageDescription: 2mm x 2mm Terminal Strip Assembly; Supplier 1: Newark; Supplier Part Number 1: 85T6611; Orientation: Vertical; RoHS: True; Temperature Range: -55 to 125 degC; Mounting Technology: Through-hole; ComponentLink1Description: Manufacturer URL; ComponentLink1URL: http://www.samtec.com; ComponentLink2Description: Datasheet; ComponentLink2URL: http://d2a072wq521u33.cloudfront.net/catalog_english//TMMH_TH.PDF; ComponentLink3Description: Package Specification; ComponentLink3URL: http://www.samtec.com/documents/webfiles/cpdf/TMMH-1XX-XX-XX-D-XXX-XXX-MKT1.pdf
footprint SMTC-TMMH-106-06-X-D (Terminal Strip Assembly, 2x6 Pins, Vertical, 2mm Pitch, Male)
pins: 1, 2, 3, 4, 5, 6, 7, 8, 9, 10, 11, 12

## TMMH-106-06-L-D
designator P?
Flexible Through-Hole Header, Vertical, -55 to 125 degC, 2 mm Pitch, 12-Pin, Male, RoHS; Manufacturer: Samtec; PartNumber: TMMH-106-06-L-D; Pitch: 2 mm; DatasheetVersion: F-214; PackageVersion: AR, 12/1996; PackageReference: TMMH-106-06-X-D; PackageDescription: 2mm x 2mm Terminal Strip Assembly; Supplier 1: Newark; Supplier Part Number 1: 85T6619; Orientation: Vertical; RoHS: True; Temperature Range: -55 to 125 degC; Mounting Technology: Through-hole; ComponentLink1Description: Manufacturer URL; ComponentLink1URL: http://www.samtec.com; ComponentLink2Description: Datasheet; ComponentLink2URL: http://d2a072wq521u33.cloudfront.net/catalog_english//TMMH_TH.PDF; ComponentLink3Description: Package Specification; ComponentLink3URL: http://www.samtec.com/documents/webfiles/cpdf/TMMH-1XX-XX-XX-D-XXX-XXX-MKT1.pdf
footprint SMTC-TMMH-106-06-X-D (Terminal Strip Assembly, 2x6 Pins, Vertical, 2mm Pitch, Male)
pins: 1, 2, 3, 4, 5, 6, 7, 8, 9, 10, 11, 12

## TMMH-106-06-T-D
designator P?
Flexible Through-Hole Header, Vertical, -55 to 105 degC, 2 mm Pitch, 12-Pin, Male, RoHS; Manufacturer: Samtec; PartNumber: TMMH-106-06-T-D; Pitch: 2 mm; DatasheetVersion: F-214; PackageVersion: AR, 12/1996; PackageReference: TMMH-106-06-X-D; PackageDescription: 2mm x 2mm Terminal Strip Assembly; Supplier 1: Newark; Supplier Part Number 1: 85T6622; Orientation: Vertical; RoHS: True; Temperature Range: -55 to 105 degC; Mounting Technology: Through-hole; ComponentLink1Description: Manufacturer URL; ComponentLink1URL: http://www.samtec.com; ComponentLink2Description: Datasheet; ComponentLink2URL: http://d2a072wq521u33.cloudfront.net/catalog_english//TMMH_TH.PDF; ComponentLink3Description: Package Specification; ComponentLink3URL: http://www.samtec.com/documents/webfiles/cpdf/TMMH-1XX-XX-XX-D-XXX-XXX-MKT1.pdf
footprint SMTC-TMMH-106-06-X-D (Terminal Strip Assembly, 2x6 Pins, Vertical, 2mm Pitch, Male)
pins: 1, 2, 3, 4, 5, 6, 7, 8, 9, 10, 11, 12